# Altium footprint library Kon_Tipk.PCBLIB: 113 footprints (part 3 of 8)
Each footprint in its own frame and in the unit in brackets; x right, y up, seen from the top. Pads: shape width x height; smd on the part's side, far side on the other; paste and mask are expansions set on the pad; w line width, h text height; cw(c..) or ccw(c..) is an arc to the next point about the centre after c.
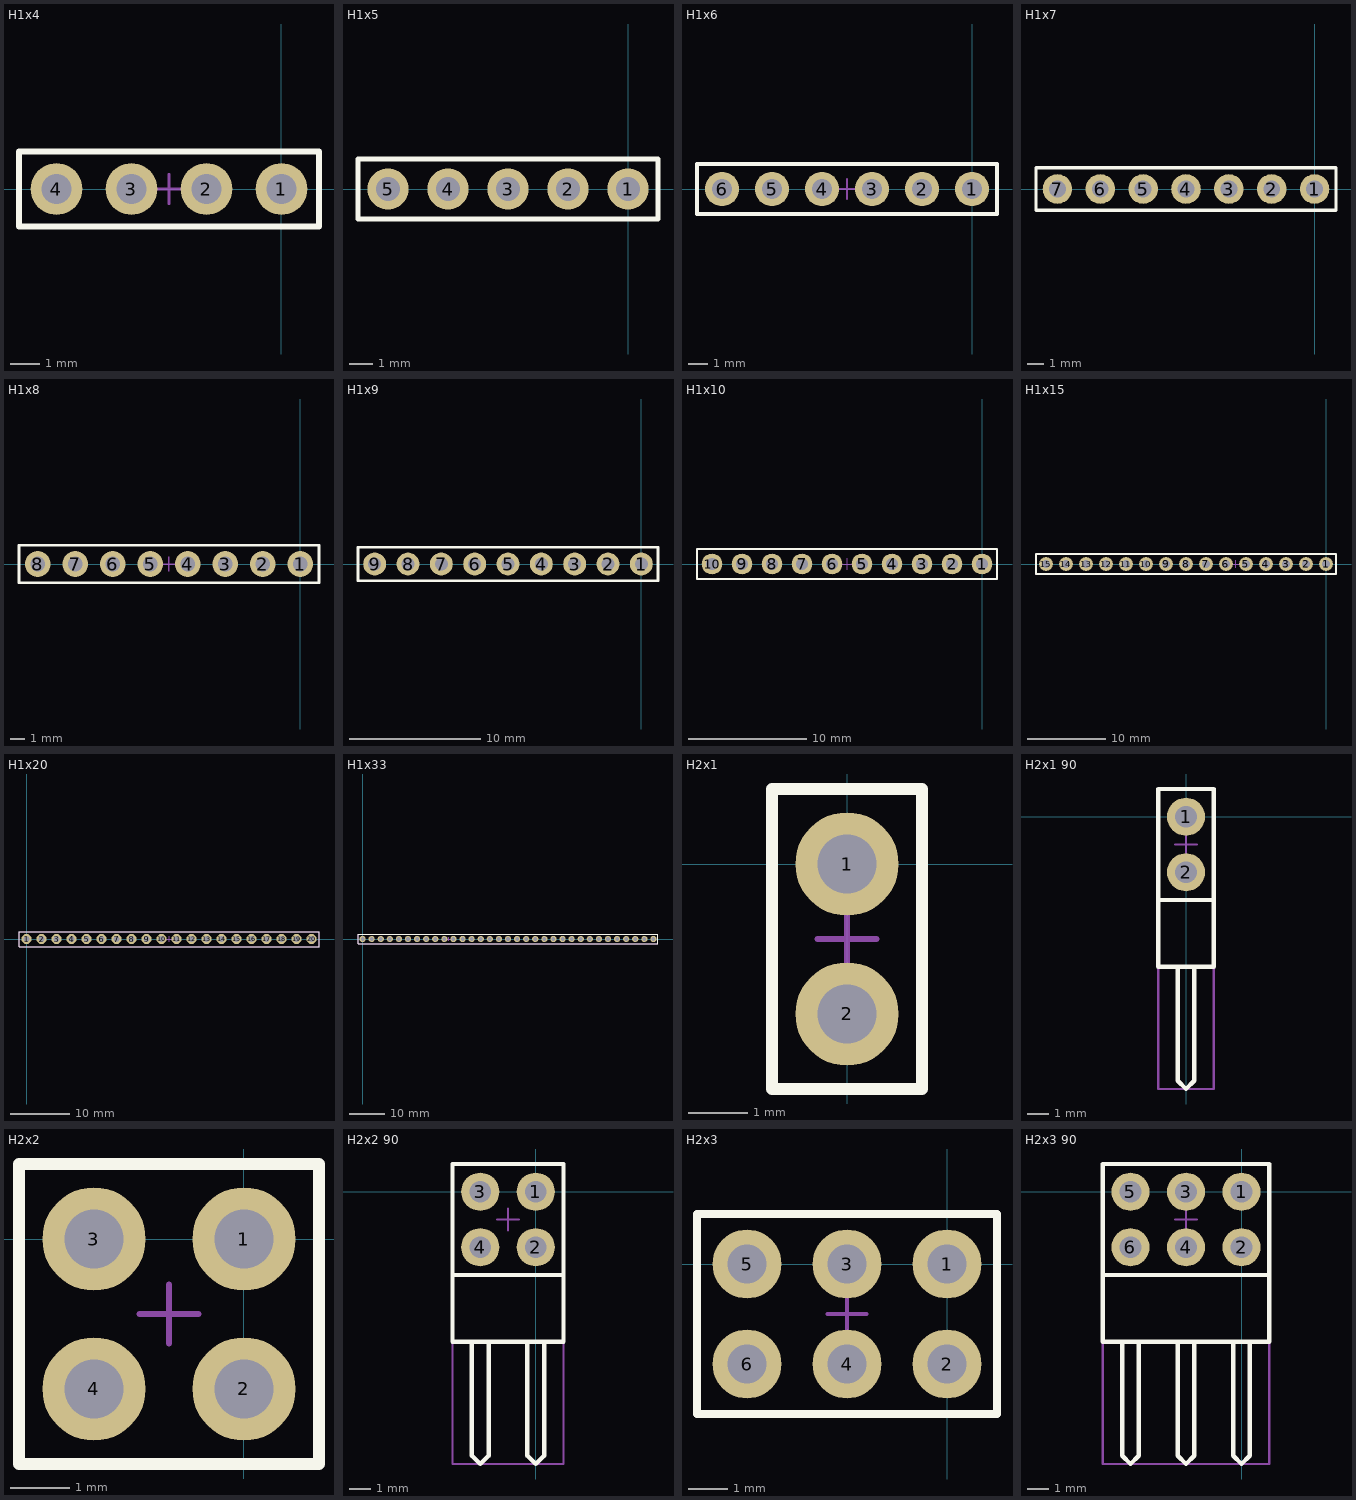
[diagram p2: the footprints below, top view; thin cyan lines are the x and y axes]

## H1x4 [mm]
height 8
pads (4):
  round 1.75 hole 1: 1(0,0) 2(-2.54,0) 3(-5.08,0) 4(-7.62,0)
Top Overlay:
  lines w0.2: -8.89,-1.27 1.27,-1.27 1.27,1.27 -8.89,1.27 -8.89,-1.27
Mechanical 13:
  lines w0.1: -8.89,-1.27 -8.89,1.27 1.27,1.27 1.27,-1.27 -8.89,-1.27
Top Courtyard:
  lines w0.1: -4.31,0 -3.31,0 ; -3.81,-0.5 -3.81,0.5 ; -8.89,-1.27 -8.89,1.27 1.27,1.27 1.27,-1.27 -8.89,-1.27
3D body "Samtec-TSW-101-07-G-S.step": height 8.4, standoff -2.52, extent -3.81,-1.27 -1.27,1.27
3D body "Samtec-TSW-101-07-G-S.step": height 8.4, standoff -2.52, extent -1.27,-1.27 1.27,1.27
3D body "Samtec-TSW-101-07-G-S.step": height 8.4, standoff -2.52, extent -6.35,-1.27 -3.81,1.27
3D body "Samtec-TSW-101-07-G-S.step": height 8.4, standoff -2.52, extent -8.89,-1.27 -6.35,1.27

## H1x5 [mm]
height 8
pads (5):
  round 1.75 hole 1: 1(0,0) 2(-2.54,0) 3(-5.08,0) 4(-7.62,0) 5(-10.16,0)
Top Overlay:
  lines w0.2: -11.43,-1.27 -11.43,1.27 1.27,1.27 1.27,-1.27 -11.43,-1.27
Mechanical 13:
  lines w0.1: -11.43,-1.27 1.27,-1.27 1.27,1.27 -11.43,1.27 -11.43,-1.27
Top Courtyard:
  lines w0.1: -5.58,0 -4.58,0 ; -5.08,-0.5 -5.08,0.5 ; -11.43,-1.27 1.27,-1.27 1.27,1.27 -11.43,1.27 -11.43,-1.27
3D body "Samtec-TSW-101-07-G-S.step": height 8.4, standoff -2.52, extent -11.43,-1.27 -8.89,1.27
3D body "Samtec-TSW-101-07-G-S.step": height 8.4, standoff -2.52, extent -8.89,-1.27 -6.35,1.27
3D body "Samtec-TSW-101-07-G-S.step": height 8.4, standoff -2.52, extent -6.35,-1.27 -3.81,1.27
3D body "Samtec-TSW-101-07-G-S.step": height 8.4, standoff -2.52, extent -1.27,-1.27 1.27,1.27
3D body "Samtec-TSW-101-07-G-S.step": height 8.4, standoff -2.52, extent -3.81,-1.27 -1.27,1.27

## H1x6 [mm]
height 8
pads (6):
  round 1.75 hole 1: 1(0,0) 2(-2.54,0) 3(-5.08,0) 4(-7.62,0) 5(-10.16,0) 6(-12.7,0)
Top Overlay:
  lines w0.2: -13.97,-1.27 -13.97,1.27 1.27,1.27 1.27,-1.27 -13.97,-1.27
Mechanical 13:
  lines w0.1: -13.97,-1.27 1.27,-1.27 1.27,1.27 -13.97,1.27 -13.97,-1.27
Top Courtyard:
  lines w0.1: -6.85,0 -5.85,0 ; -6.35,-0.5 -6.35,0.5 ; -13.97,-1.27 1.27,-1.27 1.27,1.27 -13.97,1.27 -13.97,-1.27
3D body "Samtec-TSW-101-07-G-S.step": height 8.4, standoff -2.52, extent -11.43,-1.27 -8.89,1.27
3D body "Samtec-TSW-101-07-G-S.step": height 8.4, standoff -2.52, extent -8.89,-1.27 -6.35,1.27
3D body "Samtec-TSW-101-07-G-S.step": height 8.4, standoff -2.52, extent -6.35,-1.27 -3.81,1.27
3D body "Samtec-TSW-101-07-G-S.step": height 8.4, standoff -2.52, extent -1.27,-1.27 1.27,1.27
3D body "Samtec-TSW-101-07-G-S.step": height 8.4, standoff -2.52, extent -3.81,-1.27 -1.27,1.27
3D body "Samtec-TSW-101-07-G-S.step": height 8.4, standoff -2.52, extent -13.97,-1.27 -11.43,1.27

## H1x7 [mm]
height 8
pads (7):
  round 1.75 hole 1: 1(0,0) 2(-2.54,0) 3(-5.08,0) 4(-7.62,0) 5(-10.16,0) 6(-12.7,0) 7(-15.24,0)
Top Overlay:
  lines w0.2: -16.51,-1.27 -16.51,1.27 1.27,1.27 1.27,-1.27 -16.51,-1.27
Mechanical 13:
  lines w0.1: -16.51,-1.27 1.27,-1.27 1.27,1.27 -16.51,1.27 -16.51,-1.27
Top Courtyard:
  lines w0.1: -8.12,0 -7.12,0 ; -7.62,-0.5 -7.62,0.5 ; -16.51,-1.27 1.27,-1.27 1.27,1.27 -16.51,1.27 -16.51,-1.27
3D body "Samtec-TSW-101-07-G-S.step": height 8.4, standoff -2.52, extent -16.51,-1.27 -13.97,1.27
3D body "Samtec-TSW-101-07-G-S.step": height 8.4, standoff -2.52, extent -11.43,-1.27 -8.89,1.27
3D body "Samtec-TSW-101-07-G-S.step": height 8.4, standoff -2.52, extent -8.89,-1.27 -6.35,1.27
3D body "Samtec-TSW-101-07-G-S.step": height 8.4, standoff -2.52, extent -6.35,-1.27 -3.81,1.27
3D body "Samtec-TSW-101-07-G-S.step": height 8.4, standoff -2.52, extent -1.27,-1.27 1.27,1.27
3D body "Samtec-TSW-101-07-G-S.step": height 8.4, standoff -2.52, extent -3.81,-1.27 -1.27,1.27
3D body "Samtec-TSW-101-07-G-S.step": height 8.4, standoff -2.52, extent -13.97,-1.27 -11.43,1.27

## H1x8 [mm]
height 8
pads (8):
  round 1.75 hole 1: 1(0,0) 2(-2.54,0) 3(-5.08,0) 4(-7.62,0) 5(-10.16,0) 6(-12.7,0) 7(-15.24,0) 8(-17.78,0)
Top Overlay:
  lines w0.2: -19.05,-1.27 1.27,-1.27 1.27,1.27 -19.05,1.27 -19.05,-1.27
Mechanical 13:
  lines w0.1: -19.05,-1.27 -19.05,1.27 1.27,1.27 1.27,-1.27 -19.05,-1.27
Top Courtyard:
  lines w0.1: -9.39,0 -8.39,0 ; -8.89,-0.5 -8.89,0.5 ; -19.05,-1.27 -19.05,1.27 1.27,1.27 1.27,-1.27 -19.05,-1.27
3D body "Samtec-TSW-101-07-G-S.step": height 8.4, standoff -2.52, extent -13.97,-1.27 -11.43,1.27
3D body "Samtec-TSW-101-07-G-S.step": height 8.4, standoff -2.52, extent -3.81,-1.27 -1.27,1.27
3D body "Samtec-TSW-101-07-G-S.step": height 8.4, standoff -2.52, extent -1.27,-1.27 1.27,1.27
3D body "Samtec-TSW-101-07-G-S.step": height 8.4, standoff -2.52, extent -6.35,-1.27 -3.81,1.27
3D body "Samtec-TSW-101-07-G-S.step": height 8.4, standoff -2.52, extent -8.89,-1.27 -6.35,1.27
3D body "Samtec-TSW-101-07-G-S.step": height 8.4, standoff -2.52, extent -11.43,-1.27 -8.89,1.27
3D body "Samtec-TSW-101-07-G-S.step": height 8.4, standoff -2.52, extent -16.51,-1.27 -13.97,1.27
3D body "Samtec-TSW-101-07-G-S.step": height 8.4, standoff -2.52, extent -19.05,-1.27 -16.51,1.27

## H1x9 [mm]
height 8
pads (9):
  round 1.75 hole 1: 1(0,0) 2(-2.54,0) 3(-5.08,0) 4(-7.62,0) 5(-10.16,0) 6(-12.7,0) 7(-15.24,0) 8(-17.78,0) 9(-20.32,0)
Top Overlay:
  lines w0.2: -21.59,-1.27 -21.59,1.27 1.27,1.27 1.27,-1.27 -21.59,-1.27
Mechanical 13:
  lines w0.1: -21.59,-1.27 1.27,-1.27 1.27,1.27 -21.59,1.27 -21.59,-1.27
Top Courtyard:
  lines w0.1: -10.66,0 -9.66,0 ; -10.16,-0.5 -10.16,0.5 ; -21.59,-1.27 1.27,-1.27 1.27,1.27 -21.59,1.27 -21.59,-1.27
3D body "Samtec-TSW-101-07-G-S.step": height 8.4, standoff -2.52, extent -19.05,-1.27 -16.51,1.27
3D body "Samtec-TSW-101-07-G-S.step": height 8.4, standoff -2.52, extent -16.51,-1.27 -13.97,1.27
3D body "Samtec-TSW-101-07-G-S.step": height 8.4, standoff -2.52, extent -11.43,-1.27 -8.89,1.27
3D body "Samtec-TSW-101-07-G-S.step": height 8.4, standoff -2.52, extent -8.89,-1.27 -6.35,1.27
3D body "Samtec-TSW-101-07-G-S.step": height 8.4, standoff -2.52, extent -6.35,-1.27 -3.81,1.27
3D body "Samtec-TSW-101-07-G-S.step": height 8.4, standoff -2.52, extent -1.27,-1.27 1.27,1.27
3D body "Samtec-TSW-101-07-G-S.step": height 8.4, standoff -2.52, extent -3.81,-1.27 -1.27,1.27
3D body "Samtec-TSW-101-07-G-S.step": height 8.4, standoff -2.52, extent -13.97,-1.27 -11.43,1.27
3D body "Samtec-TSW-101-07-G-S.step": height 8.4, standoff -2.52, extent -21.59,-1.27 -19.05,1.27

## H1x10 [mm]
height 8
pads (10):
  round 1.75 hole 1: 1(0,0) 2(-2.54,0) 3(-5.08,0) 4(-7.62,0) 5(-10.16,0) 6(-12.7,0) 7(-15.24,0) 8(-17.78,0) 9(-20.32,0) 10(-22.86,0)
Top Overlay:
  lines w0.2: -24.13,-1.27 -24.13,1.27 1.27,1.27 1.27,-1.27 -24.13,-1.27
Mechanical 13:
  lines w0.1: -24.13,-1.27 1.27,-1.27 1.27,1.27 -24.13,1.27 -24.13,-1.27
Top Courtyard:
  lines w0.1: -11.93,0 -10.93,0 ; -11.43,-0.5 -11.43,0.5 ; -24.13,-1.27 1.27,-1.27 1.27,1.27 -24.13,1.27 -24.13,-1.27
3D body "Samtec-TSW-101-07-G-S.step": height 8.4, standoff -2.52, extent -24.13,-1.27 -21.59,1.27
3D body "Samtec-TSW-101-07-G-S.step": height 8.4, standoff -2.52, extent -19.05,-1.27 -16.51,1.27
3D body "Samtec-TSW-101-07-G-S.step": height 8.4, standoff -2.52, extent -16.51,-1.27 -13.97,1.27
3D body "Samtec-TSW-101-07-G-S.step": height 8.4, standoff -2.52, extent -11.43,-1.27 -8.89,1.27
3D body "Samtec-TSW-101-07-G-S.step": height 8.4, standoff -2.52, extent -8.89,-1.27 -6.35,1.27
3D body "Samtec-TSW-101-07-G-S.step": height 8.4, standoff -2.52, extent -6.35,-1.27 -3.81,1.27
3D body "Samtec-TSW-101-07-G-S.step": height 8.4, standoff -2.52, extent -1.27,-1.27 1.27,1.27
3D body "Samtec-TSW-101-07-G-S.step": height 8.4, standoff -2.52, extent -3.81,-1.27 -1.27,1.27
3D body "Samtec-TSW-101-07-G-S.step": height 8.4, standoff -2.52, extent -13.97,-1.27 -11.43,1.27
3D body "Samtec-TSW-101-07-G-S.step": height 8.4, standoff -2.52, extent -21.59,-1.27 -19.05,1.27

## H1x15 [mm]
height 8
pads (15):
  round 1.75 hole 1: 1(0,0) 2(-2.54,0) 3(-5.08,0) 4(-7.62,0) 5(-10.16,0) 6(-12.7,0) 7(-15.24,0) 8(-17.78,0) 9(-20.32,0) 10(-22.86,0) 11(-25.4,0) 12(-27.94,0) 13(-30.48,0) 14(-33.02,0) 15(-35.56,0)
Top Overlay:
  lines w0.2: -36.83,-1.27 1.27,-1.27 1.27,1.27 -36.83,1.27 -36.83,-1.27
Mechanical 13:
  lines w0.1: -36.83,-1.27 1.27,-1.27 1.27,1.27 -36.83,1.27 -36.83,-1.27
Top Courtyard:
  lines w0.1: -11.93,0 -10.93,0 ; -11.43,-0.5 -11.43,0.5 ; -36.83,-1.27 1.27,-1.27 1.27,1.27 -36.83,1.27 -36.83,-1.27
3D body "Samtec-TSW-101-07-G-S.step": height 8.4, standoff -2.52, extent -31.75,-1.27 -29.21,1.27
3D body "Samtec-TSW-101-07-G-S.step": height 8.4, standoff -2.52, extent -36.83,-1.27 -34.29,1.27
3D body "Samtec-TSW-101-07-G-S.step": height 8.4, standoff -2.52, extent -34.29,-1.27 -31.75,1.27
3D body "Samtec-TSW-101-07-G-S.step": height 8.4, standoff -2.52, extent -29.21,-1.27 -26.67,1.27
3D body "Samtec-TSW-101-07-G-S.step": height 8.4, standoff -2.52, extent -26.67,-1.27 -24.13,1.27
3D body "Samtec-TSW-101-07-G-S.step": height 8.4, standoff -2.52, extent -24.13,-1.27 -21.59,1.27
3D body "Samtec-TSW-101-07-G-S.step": height 8.4, standoff -2.52, extent -19.05,-1.27 -16.51,1.27
3D body "Samtec-TSW-101-07-G-S.step": height 8.4, standoff -2.52, extent -16.51,-1.27 -13.97,1.27
3D body "Samtec-TSW-101-07-G-S.step": height 8.4, standoff -2.52, extent -11.43,-1.27 -8.89,1.27
3D body "Samtec-TSW-101-07-G-S.step": height 8.4, standoff -2.52, extent -8.89,-1.27 -6.35,1.27
3D body "Samtec-TSW-101-07-G-S.step": height 8.4, standoff -2.52, extent -6.35,-1.27 -3.81,1.27
3D body "Samtec-TSW-101-07-G-S.step": height 8.4, standoff -2.52, extent -1.27,-1.27 1.27,1.27
3D body "Samtec-TSW-101-07-G-S.step": height 8.4, standoff -2.52, extent -3.81,-1.27 -1.27,1.27
3D body "Samtec-TSW-101-07-G-S.step": height 8.4, standoff -2.52, extent -13.97,-1.27 -11.43,1.27
3D body "Samtec-TSW-101-07-G-S.step": height 8.4, standoff -2.52, extent -21.59,-1.27 -19.05,1.27

## H1x20 [mm]
height 8
pads (20):
  round 1.75 hole 1: 1(0,0) 2(2.54,0) 3(5.08,0) 4(7.62,0) 5(10.16,0) 6(12.7,0) 7(15.24,0) 8(17.78,0) 9(20.32,0) 10(22.86,0) 11(25.4,0) 12(27.94,0) 13(30.48,0) 14(33.02,0) 15(35.56,0) 16(38.1,0) 17(40.64,0) 18(43.18,0) 19(45.72,0) 20(48.26,0)
Top Overlay:
  lines w0.2: -1.27,-1.27 -1.27,1.27 49.53,1.27 49.53,-1.27 -1.27,-1.27
Mechanical 13:
  lines w0.1: -1.27,-1.27 49.53,-1.27 49.53,1.27 -1.27,1.27 -1.27,-1.27
Top Courtyard:
  lines w0.1: 23.63,0 24.63,0 ; 24.13,-0.5 24.13,0.5 ; -1.27,-1.27 49.53,-1.27 49.53,1.27 -1.27,1.27 -1.27,-1.27
3D body "Samtec-TSW-101-07-G-S.step": height 8.4, standoff -2.52, extent 1.27,-1.27 3.81,1.27
3D body "Samtec-TSW-101-07-G-S.step": height 8.4, standoff -2.52, extent -1.27,-1.27 1.27,1.27
3D body "Samtec-TSW-101-07-G-S.step": height 8.4, standoff -2.52, extent 3.81,-1.27 6.35,1.27
3D body "Samtec-TSW-101-07-G-S.step": height 8.4, standoff -2.52, extent 11.43,-1.27 13.97,1.27
3D body "Samtec-TSW-101-07-G-S.step": height 8.4, standoff -2.52, extent 21.59,-1.27 24.13,1.27
3D body "Samtec-TSW-101-07-G-S.step": height 8.4, standoff -2.52, extent 19.05,-1.27 21.59,1.27
3D body "Samtec-TSW-101-07-G-S.step": height 8.4, standoff -2.52, extent 16.51,-1.27 19.05,1.27
3D body "Samtec-TSW-101-07-G-S.step": height 8.4, standoff -2.52, extent 13.97,-1.27 16.51,1.27
3D body "Samtec-TSW-101-07-G-S.step": height 8.4, standoff -2.52, extent 8.89,-1.27 11.43,1.27
3D body "Samtec-TSW-101-07-G-S.step": height 8.4, standoff -2.52, extent 6.35,-1.27 8.89,1.27
3D body "Samtec-TSW-101-07-G-S.step": height 8.4, standoff -2.52, extent 24.13,-1.27 26.67,1.27
3D body "Samtec-TSW-101-07-G-S.step": height 8.4, standoff -2.52, extent 29.21,-1.27 31.75,1.27
3D body "Samtec-TSW-101-07-G-S.step": height 8.4, standoff -2.52, extent 31.75,-1.27 34.29,1.27
3D body "Samtec-TSW-101-07-G-S.step": height 8.4, standoff -2.52, extent 36.83,-1.27 39.37,1.27
3D body "Samtec-TSW-101-07-G-S.step": height 8.4, standoff -2.52, extent 39.37,-1.27 41.91,1.27
3D body "Samtec-TSW-101-07-G-S.step": height 8.4, standoff -2.52, extent 41.91,-1.27 44.45,1.27
3D body "Samtec-TSW-101-07-G-S.step": height 8.4, standoff -2.52, extent 46.99,-1.27 49.53,1.27
3D body "Samtec-TSW-101-07-G-S.step": height 8.4, standoff -2.52, extent 44.45,-1.27 46.99,1.27
3D body "Samtec-TSW-101-07-G-S.step": height 8.4, standoff -2.52, extent 34.29,-1.27 36.83,1.27
3D body "Samtec-TSW-101-07-G-S.step": height 8.4, standoff -2.52, extent 26.67,-1.27 29.21,1.27

## H1x33 [mm]
height 8
pads (33):
  round 1.75 hole 1: 1(0,0) 2(2.54,0) 3(5.08,0) 4(7.62,0) 5(10.16,0) 6(12.7,0) 7(15.24,0) 8(17.78,0) 9(20.32,0) 10(22.86,0) 11(25.4,0) 12(27.94,0) 13(30.48,0) 14(33.02,0) 15(35.56,0) 16(38.1,0) 17(40.64,0) 18(43.18,0) 19(45.72,0) 20(48.26,0) 21(50.8,0) 22(53.34,0) 23(55.88,0) 24(58.42,0) 25(60.96,0) 26(63.5,0) 27(66.04,0) 28(68.58,0) 29(71.12,0) 30(73.66,0) 31(76.2,0) 32(78.74,0) 33(81.28,0)
Top Overlay:
  lines w0.2: -1.27,-1.27 -1.27,1.27 82.55,1.27 82.55,-1.27 -1.27,-1.27
Mechanical 13:
  lines w0.1: -1.27,-1.27 82.55,-1.27 82.55,1.27 -1.27,1.27 -1.27,-1.27
Top Courtyard:
  lines w0.1: 23.63,0 24.63,0 ; 24.13,-0.5 24.13,0.5 ; -1.27,-1.27 82.55,-1.27 82.55,1.27 -1.27,1.27 -1.27,-1.27
3D body "Samtec-TSW-101-07-G-S.step": height 8.4, standoff -2.52, extent 1.27,-1.27 3.81,1.27
3D body "Samtec-TSW-101-07-G-S.step": height 8.4, standoff -2.52, extent -1.27,-1.27 1.27,1.27
3D body "Samtec-TSW-101-07-G-S.step": height 8.4, standoff -2.52, extent 3.81,-1.27 6.35,1.27
3D body "Samtec-TSW-101-07-G-S.step": height 8.4, standoff -2.52, extent 11.43,-1.27 13.97,1.27
3D body "Samtec-TSW-101-07-G-S.step": height 8.4, standoff -2.52, extent 21.59,-1.27 24.13,1.27
3D body "Samtec-TSW-101-07-G-S.step": height 8.4, standoff -2.52, extent 19.05,-1.27 21.59,1.27
3D body "Samtec-TSW-101-07-G-S.step": height 8.4, standoff -2.52, extent 16.51,-1.27 19.05,1.27
3D body "Samtec-TSW-101-07-G-S.step": height 8.4, standoff -2.52, extent 13.97,-1.27 16.51,1.27
3D body "Samtec-TSW-101-07-G-S.step": height 8.4, standoff -2.52, extent 8.89,-1.27 11.43,1.27
3D body "Samtec-TSW-101-07-G-S.step": height 8.4, standoff -2.52, extent 6.35,-1.27 8.89,1.27
3D body "Samtec-TSW-101-07-G-S.step": height 8.4, standoff -2.52, extent 24.13,-1.27 26.67,1.27
3D body "Samtec-TSW-101-07-G-S.step": height 8.4, standoff -2.52, extent 29.21,-1.27 31.75,1.27
3D body "Samtec-TSW-101-07-G-S.step": height 8.4, standoff -2.52, extent 31.75,-1.27 34.29,1.27
3D body "Samtec-TSW-101-07-G-S.step": height 8.4, standoff -2.52, extent 36.83,-1.27 39.37,1.27
3D body "Samtec-TSW-101-07-G-S.step": height 8.4, standoff -2.52, extent 39.37,-1.27 41.91,1.27
3D body "Samtec-TSW-101-07-G-S.step": height 8.4, standoff -2.52, extent 41.91,-1.27 44.45,1.27
3D body "Samtec-TSW-101-07-G-S.step": height 8.4, standoff -2.52, extent 46.99,-1.27 49.53,1.27
3D body "Samtec-TSW-101-07-G-S.step": height 8.4, standoff -2.52, extent 44.45,-1.27 46.99,1.27
3D body "Samtec-TSW-101-07-G-S.step": height 8.4, standoff -2.52, extent 34.29,-1.27 36.83,1.27
3D body "Samtec-TSW-101-07-G-S.step": height 8.4, standoff -2.52, extent 26.67,-1.27 29.21,1.27
3D body "Samtec-TSW-101-07-G-S.step": height 8.4, standoff -2.52, extent 49.53,-1.27 52.07,1.27
3D body "Samtec-TSW-101-07-G-S.step": height 8.4, standoff -2.52, extent 52.07,-1.27 54.61,1.27
3D body "Samtec-TSW-101-07-G-S.step": height 8.4, standoff -2.52, extent 54.61,-1.27 57.15,1.27
3D body "Samtec-TSW-101-07-G-S.step": height 8.4, standoff -2.52, extent 57.15,-1.27 59.69,1.27
3D body "Samtec-TSW-101-07-G-S.step": height 8.4, standoff -2.52, extent 59.69,-1.27 62.23,1.27
3D body "Samtec-TSW-101-07-G-S.step": height 8.4, standoff -2.52, extent 62.23,-1.27 64.77,1.27
3D body "Samtec-TSW-101-07-G-S.step": height 8.4, standoff -2.52, extent 64.77,-1.27 67.31,1.27
3D body "Samtec-TSW-101-07-G-S.step": height 8.4, standoff -2.52, extent 67.31,-1.27 69.85,1.27
3D body "Samtec-TSW-101-07-G-S.step": height 8.4, standoff -2.52, extent 69.85,-1.27 72.39,1.27
3D body "Samtec-TSW-101-07-G-S.step": height 8.4, standoff -2.52, extent 72.39,-1.27 74.93,1.27
3D body "Samtec-TSW-101-07-G-S.step": height 8.4, standoff -2.52, extent 74.93,-1.27 77.47,1.27
3D body "Samtec-TSW-101-07-G-S.step": height 8.4, standoff -2.52, extent 77.47,-1.27 80.01,1.27
3D body "Samtec-TSW-101-07-G-S.step": height 8.4, standoff -2.52, extent 80.01,-1.27 82.55,1.27

## H2x1 [mm]
height 8
pads (2):
  round 1.75 hole 1: 1(0,0) 2(0,-2.54)
Top Overlay:
  lines w0.2: -1.27,-3.81 1.27,-3.81 1.27,1.27 -1.27,1.27 -1.27,-3.81
Mechanical 13:
  lines w0.1: -1.27,-3.81 1.27,-3.81 1.27,1.27 -1.27,1.27 -1.27,-3.81
Top Courtyard:
  lines w0.1: -0.5,-1.27 0.5,-1.27 ; 0,-1.77 0,-0.77 ; -1.27,-3.81 -1.27,1.27 1.27,1.27 1.27,-3.81 -1.27,-3.81
3D body "Samtec-TSW-101-07-G-D.step": height 8.4, standoff -2.52, extent -1.27,-3.81 1.27,1.27

## H2x1 90 [mm]
height 8
pads (2):
  round 1.75 hole 1: 1(0,0) 2(0,-2.54)
Top Overlay:
  lines w0.2: -1.27,-3.81 1.27,-3.81 ; -0.381,-6.858 -0.381,-12.078 0,-12.459 0.381,-12.078 0.381,-6.858 ; -1.27,-6.858 1.27,-6.858 1.27,1.27 -1.27,1.27 -1.27,-6.858
Mechanical 13:
  lines w0.1: -1.27,-12.459 1.27,-12.459 1.27,1.27 -1.27,1.27 -1.27,-12.459
Top Courtyard:
  lines w0.1: -0.5,-1.27 0.5,-1.27 ; 0,-1.77 0,-0.77 ; -1.27,-12.459 -1.27,1.27 1.27,1.27 1.27,-12.459 -1.27,-12.459
3D body "Samtec-TSW-101-08-G-D-RA.step": height 5.6, standoff -2.27, extent -1.27,-12.459 1.27,0.305

## H2x2 [mm]
height 8
pads (4):
  round 1.75 hole 1: 1(0,0) 2(0,-2.54) 3(-2.54,0) 4(-2.54,-2.54)
Top Overlay:
  lines w0.2: -3.81,-3.81 1.27,-3.81 1.27,1.27 -3.81,1.27 -3.81,-3.81
Mechanical 13:
  lines w0.1: -3.81,-3.81 1.27,-3.81 1.27,1.27 -3.81,1.27 -3.81,-3.81
Top Courtyard:
  lines w0.1: -1.77,-1.27 -0.77,-1.27 ; -1.27,-1.77 -1.27,-0.77 ; -3.81,-3.81 -3.81,1.27 1.27,1.27 1.27,-3.81 -3.81,-3.81
3D body "Samtec-TSW-101-07-G-D.step": height 8.4, standoff -2.52, extent -3.81,-3.81 -1.27,1.27
3D body "Samtec-TSW-101-07-G-D.step": height 8.4, standoff -2.52, extent -1.27,-3.81 1.27,1.27

## H2x2 90 [mm]
height 8
pads (4):
  round 1.75 hole 1: 1(0,0) 2(0,-2.54) 3(-2.54,0) 4(-2.54,-2.54)
Top Overlay:
  lines w0.2: -3.81,-3.81 1.27,-3.81 ; -2.921,-6.858 -2.921,-12.078 -2.54,-12.459 -2.159,-12.078 -2.159,-6.858 ; -0.381,-6.858 -0.381,-12.078 0,-12.459 0.381,-12.078 0.381,-6.858 ; -3.81,-6.858 1.27,-6.858 1.27,1.27 -3.81,1.27 -3.81,-6.858
Mechanical 13:
  lines w0.1: -3.81,-12.459 1.27,-12.459 1.27,1.27 -3.81,1.27 -3.81,-12.459
Top Courtyard:
  lines w0.1: -1.77,-1.27 -0.77,-1.27 ; -1.27,-1.77 -1.27,-0.77 ; -3.81,-12.459 1.27,-12.459 1.27,1.27 -3.81,1.27 -3.81,-12.459
3D body "Samtec-TSW-101-08-G-D-RA.step": height 5.6, standoff -2.27, extent -1.27,-12.459 1.27,0.305
3D body "Samtec-TSW-101-08-G-D-RA.step": height 5.6, standoff -2.27, extent -3.81,-12.459 -1.27,0.305

## H2x3 [mm]
height 8
pads (6):
  round 1.75 hole 1: 1(0,0) 2(0,-2.54) 3(-2.54,0) 4(-2.54,-2.54) 5(-5.08,0) 6(-5.08,-2.54)
Top Overlay:
  lines w0.2: -6.35,-3.81 -6.35,1.27 1.27,1.27 1.27,-3.81 -6.35,-3.81
Mechanical 13:
  lines w0.1: -6.35,-3.81 -6.35,1.27 1.27,1.27 1.27,-3.81 -6.35,-3.81
Top Courtyard:
  lines w0.1: -3.04,-1.27 -2.04,-1.27 ; -2.54,-1.77 -2.54,-0.77 ; -6.35,-3.81 1.27,-3.81 1.27,1.27 -6.35,1.27 -6.35,-3.81
3D body "Samtec-TSW-101-07-G-D.step": height 8.4, standoff -2.52, extent -3.81,-3.81 -1.27,1.27
3D body "Samtec-TSW-101-07-G-D.step": height 8.4, standoff -2.52, extent -6.35,-3.81 -3.81,1.27
3D body "Samtec-TSW-101-07-G-D.step": height 8.4, standoff -2.52, extent -1.27,-3.81 1.27,1.27

## H2x3 90 [mm]
height 8
pads (6):
  round 1.75 hole 1: 1(0,0) 2(0,-2.54) 3(-2.54,0) 4(-2.54,-2.54) 5(-5.08,0) 6(-5.08,-2.54)
Top Overlay:
  lines w0.2: -6.35,-3.81 1.27,-3.81 ; -5.461,-6.858 -5.461,-12.078 -5.08,-12.459 -4.699,-12.078 -4.699,-6.858 ; -2.921,-6.858 -2.921,-12.078 -2.54,-12.459 -2.159,-12.078 -2.159,-6.858 ; -0.381,-6.858 -0.381,-12.078 0,-12.459 0.381,-12.078 0.381,-6.858 ; -6.35,-6.858 1.27,-6.858 1.27,1.27 -6.35,1.27 -6.35,-6.858
Mechanical 13:
  lines w0.1: -6.35,-12.459 1.27,-12.459 1.27,1.27 -6.35,1.27 -6.35,-12.459
Top Courtyard:
  lines w0.1: -3.04,-1.27 -2.04,-1.27 ; -2.54,-1.77 -2.54,-0.77 ; -6.35,-12.459 1.27,-12.459 1.27,1.27 -6.35,1.27 -6.35,-12.459
3D body "Samtec-TSW-101-08-G-D-RA.step": height 5.6, standoff -2.27, extent -3.81,-12.459 -1.27,0.305
3D body "Samtec-TSW-101-08-G-D-RA.step": height 5.6, standoff -2.27, extent -1.27,-12.459 1.27,0.305
3D body "Samtec-TSW-101-08-G-D-RA.step": height 5.6, standoff -2.27, extent -6.35,-12.459 -3.81,0.305